# Altium footprint library Connector.PcbLib: 129 footprints (part 8 of 9)
Each footprint in its own frame and in the unit in brackets; x right, y up, seen from the top. Pads: shape width x height; smd on the part's side, far side on the other; paste and mask are expansions set on the pad; w line width, h text height; cw(c..) or ccw(c..) is an arc to the next point about the centre after c.
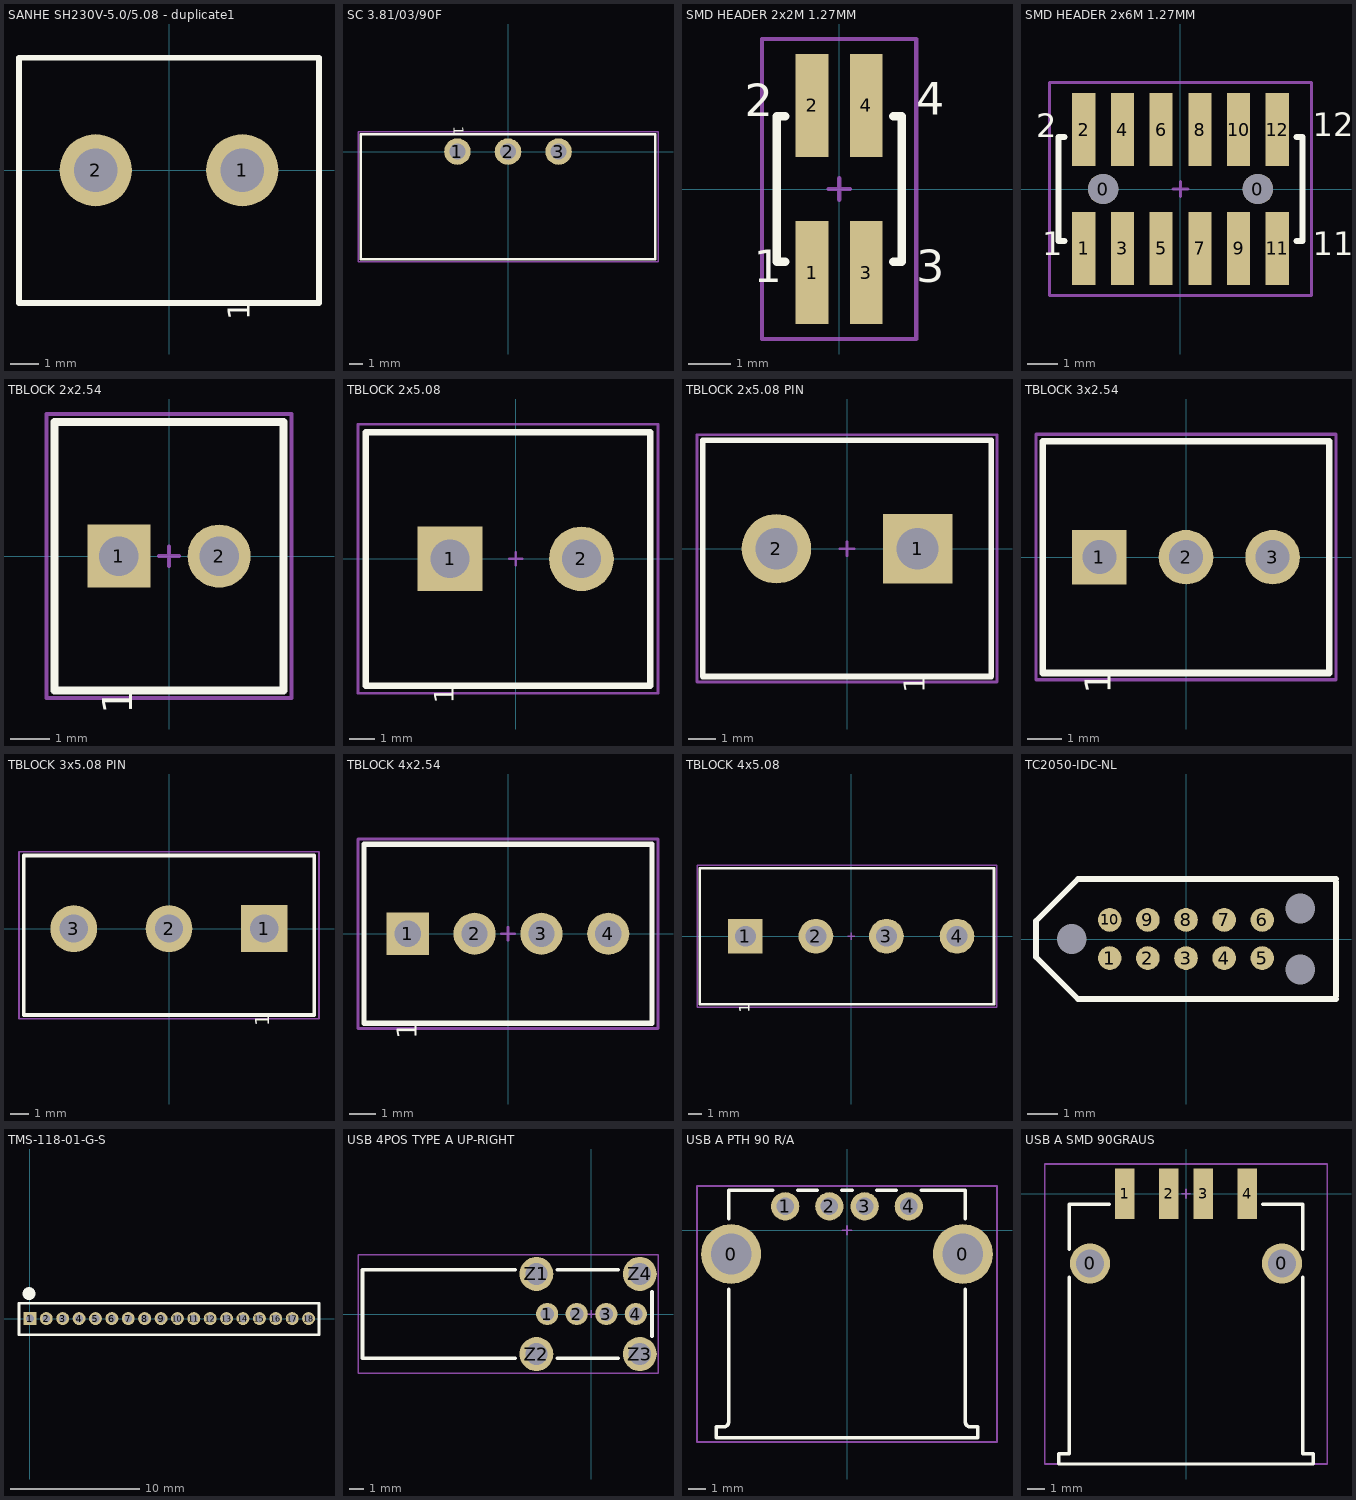
[diagram p7: the footprints below, top view; thin cyan lines are the x and y axes]

## SANHE SH230V-5.0/5.08 - duplicate1 [mm]
pads (2):
  round 2.5 hole 1.5: 1(2.54,0) 2(-2.54,0)
Top Overlay:
  lines w0.2: -5.2,-4.6 -3.3,-4.6 5.2,-4.6 5.2,3.9 -5.2,3.9 -5.2,-4.6
  text "1" at 2.8,-5.2 h0.76
3D body "Terminal Block 2x5.08mm.STEP": height 12.1, standoff -4.5, extent -5.08,-4.45 5.08,3.75

## SC 3.81/03/90F [mm]
height 7.1
pads (3):
  round 2 hole 1.2: 1(-3.81,0) 2(0,0) 3(3.81,0)
Top Overlay:
  lines w0.2: -11.1,-8.1 11.1,-8.1 11.1,1.3 -11.1,1.3 -11.1,-8.1
  text "1" at -4.1,1.9 h0.76
Mechanical 15:
  lines w0.1: -0.25,0 0.25,0 ; 0,-0.25 0,0.25 ; -11.3,-8.3 11.3,-8.3 11.3,1.5 -11.3,1.5 -11.3,-8.3
3D body "SC 3.81_3_90F3.2SN SW 1793340000.STEP": height 7.1, standoff -3.15, extent -11.01,-8 11.01,1.2

## SMD HEADER 2x2M 1.27MM [mm]
pads (4):
  rect 0.76x2.4 smd: 1(-0.635,-1.95) 2(-0.635,1.95) 3(0.635,-1.95) 4(0.635,1.95)
Top Overlay:
  lines w0.2: -1.26,-1.7 -1.46,-1.7 -1.46,1.7 -1.26,1.7 ; 1.26,-1.7 1.46,-1.7 1.46,1.7 1.26,1.7
  text "1" at -2,-2.17 h0.76
  text "3" at 1.8,-2.17 h0.76
  text "4" at 1.8,1.73 h0.76
  text "2" at -2.2,1.7 h0.76
Mechanical 15:
  lines w0.1: -0.25,0 0.25,0 ; 0,-0.25 0,0.25 ; -1.8,-3.5 -1.8,3.5 1.8,3.5 1.8,-3.5 -1.8,-3.5
3D body "pin_header_a-sl127-dg-g04mp1.STEP": height 6.4, standoff 0, extent -1.27,-2.752 1.27,2.752

## SMD HEADER 2x6M 1.27MM [mm]
pads (14):
  round 1 hole 1 unplated: 0(-2.54,0) 0(2.54,0)
  rect 0.76x2.4 smd: 1(-3.175,-1.95) 2(-3.175,1.95) 3(-1.905,-1.95) 4(-1.905,1.95) 5(-0.635,-1.95) 6(-0.635,1.95) 7(0.635,-1.95) 8(0.635,1.95) 9(1.905,-1.95) 10(1.905,1.95) 11(3.175,-1.95) 12(3.175,1.95)
Top Overlay:
  lines w0.2: -3.8,-1.7 -4,-1.7 -4,1.7 -3.8,1.7 ; 3.8,-1.7 4,-1.7 4,1.7 3.8,1.7
  text "2" at -4.74,1.7 h0.76
  text "1" at -4.54,-2.17 h0.76
  text "11" at 4.34,-2.17 h0.76
  text "12" at 4.34,1.73 h0.76
Mechanical 15:
  lines w0.1: -0.25,0 0.25,0 ; 0,-0.25 0,0.25 ; -4.3,-3.5 4.3,-3.5 4.3,3.5 -4.3,3.5 -4.3,-3.5
3D body "pin_header_a-sl127-dg-g12mp1.STEP": height 6.4, standoff 0, extent -3.81,-2.752 3.81,2.752

## TBLOCK 2x2.54 [mm]
pads (2):
  rect 1.6x1.6 hole 1: 1(-1.27,0)
  round 1.6 hole 1: 2(1.27,0)
Top Overlay:
  lines w0.2: -2.9,-3.4 -2.9,3.4 2.9,3.4 2.9,-3.4 -2.9,-3.4
  text "1" at -0.93,-4 h0.76
Mechanical 15:
  lines w0.1: -0.25,0 0.25,0 ; 0,-0.25 0,0.25 ; -3.1,-3.6 3.1,-3.6 3.1,3.6 -3.1,3.6 -3.1,-3.6
3D body "c-282834-2-c-3d.STEP": height 10.1, standoff -3.3, extent -2.77,-3.25 2.77,3.25

## TBLOCK 2x5.08 [mm]
pads (2):
  rect 2.5x2.5 hole 1.5: 1(-2.54,0)
  round 2.5 hole 1.5: 2(2.54,0)
Top Overlay:
  lines w0.254: -5.8,-4.9 5.2,-4.9 5.2,4.9 -5.8,4.9 -5.8,-4.9
  text "1" at -2.4,-5.6 h0.76
Mechanical 15:
  lines w0.1: -0.25,0 0.25,0 ; 0,-0.25 0,0.25 ; -6.1,-5.2 -6.1,5.2 5.5,5.2 5.5,-5.2 -6.1,-5.2
3D body "38261.stp": height 15.5, standoff -3, extent -5.64,-4.75 5.09,4.75

## TBLOCK 2x5.08 PIN [mm]
pads (2):
  rect 2.5x2.5 hole 1.5: 1(2.54,0)
  round 2.5 hole 1.5: 2(-2.54,0)
Top Overlay:
  lines w0.2: -5.2,-4.6 -5.2,3.9 5.2,3.9 5.2,-4.6 -3.3,-4.6 -5.2,-4.6
  text "1" at 2.8,-5.2 h0.76
Mechanical 15:
  lines w0.1: -0.25,0 0.25,0 ; 0,-0.25 0,0.25 ; -5.4,-4.8 5.4,-4.8 5.4,4.1 -5.4,4.1 -5.4,-4.8
3D body "User Library-Terminal Block 2x5_08mm.step": height 12.1, standoff -4.5, extent -5.08,-4.45 5.08,3.75

## TBLOCK 3x2.54 [mm]
pads (3):
  rect 1.6x1.6 hole 1: 1(-2.54,0)
  round 1.6 hole 1: 2(0,0) 3(2.54,0)
Top Overlay:
  lines w0.2: -4.2,-3.4 -4.2,3.4 4.2,3.4 4.2,-3.4 -4.2,-3.4
  text "1" at -2.2,-4 h0.76
Mechanical 15:
  lines w0.1: -0.25,0 0.25,0 ; 0,-0.25 0,0.25 ; -4.4,-3.6 -4.4,3.6 4.4,3.6 4.4,-3.6 -4.4,-3.6
3D body "c-282834-3-c-3d.STEP": height 10.1, standoff -3.3, extent -4.04,-3.25 4.04,3.25

## TBLOCK 3x5.08 PIN [mm]
pads (3):
  rect 2.5x2.5 hole 1.5: 1(5.08,0)
  round 2.5 hole 1.5: 2(0,0) 3(-5.08,0)
Top Overlay:
  lines w0.2: -7.74,-4.6 -0.76,-4.6 7.74,-4.6 7.74,3.9 -7.74,3.9 -7.74,-4.6
  text "1" at 5.34,-5.2 h0.76
Mechanical 15:
  lines w0.1: -0.25,0 0.25,0 ; 0,-0.25 0,0.25 ; -8,-4.8 8,-4.8 8,4.1 -8,4.1 -8,-4.8
3D body "User Library-Terminal Block 3x5_08mm.step": height 12.1, standoff -4.5, extent -7.62,-4.45 7.62,3.75

## TBLOCK 4x2.54 [mm]
pads (4):
  rect 1.6x1.6 hole 1: 1(-3.81,0)
  round 1.6 hole 1: 2(-1.27,0) 3(1.27,0) 4(3.81,0)
Top Overlay:
  lines w0.2: -5.47,-3.4 5.47,-3.4 5.47,3.4 -5.47,3.4 -5.47,-3.4
  text "1" at -3.47,-4 h0.76
Mechanical 15:
  lines w0.1: -0.25,0 0.25,0 ; 0,-0.25 0,0.25 ; -5.7,-3.6 5.7,-3.6 5.7,3.6 -5.7,3.6 -5.7,-3.6
3D body "c-282834-4-c-3d.STEP": height 10.1, standoff -3.3, extent -5.31,-3.25 5.31,3.25

## TBLOCK 4x5.08 [mm]
pads (4):
  rect 2.5x2.5 hole 1.5: 1(-7.62,0)
  round 2.5 hole 1.5: 2(-2.54,0) 3(2.54,0) 4(7.62,0)
Top Overlay:
  lines w0.2: -10.9,-4.9 -10.9,4.9 -2.08,4.9 10.28,4.9 10.28,-4.9 -10.9,-4.9
  text "1" at -7.3,-5.5 h0.76
Mechanical 15:
  lines w0.1: -0.25,0 0.25,0 ; 0,-0.25 0,0.25 ; -11.1,-5.1 -11.1,5.1 10.5,5.1 10.5,-5.1 -11.1,-5.1
3D body "38261.stp": height 15.5, standoff -3, extent -10.72,-4.75 0.01,4.75
3D body "38261.stp": height 15.5, standoff -3, extent -0.56,-4.75 10.17,4.75

## TC2050-IDC-NL [mm]
pads (13):
  round 0.787 smd: 1(-2.54,-0.635) 2(-1.27,-0.635) 3(0,-0.635) 4(1.27,-0.635) 5(2.54,-0.635) 6(2.54,0.635) 7(1.27,0.635) 8(0,0.635) 9(-1.27,0.635) 10(-2.54,0.635)
  round 0 hole 0.991 unplated: 11(-3.81,0) 12(3.81,-1.015) 13(3.81,1.015)
Top Overlay:
  lines w0.2: 5,-2 -3.6,-2 -5,-0.6 -5,0.6 -3.6,2 ; 5,-1.9 5,1.9 ; 5,2 -3.6,2 ; -3.6,2 -3.6,2

## TMS-118-01-G-S [mm]
pads (18):
  rect 1x1 hole 0.6: 1(0,0)
  round 1 hole 0.6: 2(1.27,0) 3(2.54,0) 4(3.81,0) 5(5.08,0) 6(6.35,0) 7(7.62,0) 8(8.89,0) 9(10.16,0) 10(11.43,0) 11(12.7,0) 12(13.97,0) 13(15.24,0) 14(16.51,0) 15(17.78,0) 16(19.05,0) 17(20.32,0) 18(21.59,0)
Top Overlay:
  lines w0.2: -0.845,-1.238 -0.845,1.2 22.4,1.2 22.4,-1.238 -0.845,-1.238
  lines w1: -0.075,1.925 -0.075,1.95
3D body "TMS-118-01-G-S.STEP": height 8.38, standoff -3.05, extent -0.625,-1.238 22.235,1.2

## USB 4POS TYPE A UP-RIGHT [mm]
height 14.5
pads (8):
  round 1.5 hole 0.92: 1(-3,0) 2(-1,0) 3(1,0) 4(3,0)
  round 2.3 hole 1.5: Z1(-3.73,2.71) Z2(-3.73,-2.71) Z3(3.27,-2.71) Z4(3.27,2.71)
Top Overlay:
  lines w0.254: -5.16,-3 -15.5,-3 -15.5,3 -5.16,3 ; -2.3,-3 1.8,-3 ; -2.3,3 1.8,3 ; 4.1,-1.5 4.1,1.5
Mechanical 15:
  lines w0.1: -0.25,0 0.25,0 ; 0,-0.25 0,0.25 ; -15.8,-4 -15.8,4 4.5,4 4.5,-4 -15.8,-4
3D body "STEP-614004134726-rev1.STEP": height 14.51, standoff -3.8, extent -15.345,-3.55 3.955,3.55

## USB A PTH 90 R/A [mm]
height 6.9
pads (6):
  round 3.4 hole 2.3: 0(-6.57,-1.35) 0(6.57,-1.35)
  round 1.6 hole 1: 1(-3.5,1.35) 2(-1,1.35) 3(1,1.35) 4(3.5,1.35)
Top Overlay:
  lines w0.2: -6.7,-3.35 -6.7,-10.85 cw(c-7,-10.85) -7,-11.15 -7.4,-11.15 -7.4,-11.75 7.4,-11.75 7.4,-11.15 7,-11.15 cw(c7,-10.85) 6.7,-10.85 6.7,-3.35 ; -6.7,0.65 -6.7,2.25 -4.2,2.25 ; -2.8,2.25 -1.7,2.25 ; -0.3,2.25 0.3,2.25 ; 1.7,2.25 2.8,2.25 ; 4.2,2.25 6.7,2.25 6.7,0.65
Mechanical 15:
  lines w0.1: -0.25,0 0.25,0 ; 0,-0.25 0,0.25 ; -8.5,-12 8.5,-12 8.5,2.5 -8.5,2.5 -8.5,-12
3D body "M-UE27-AC54-100-REVT1.STEP": height 7.7, standoff -3.05, extent -7.426,-11.65 7.426,2.15

## USB A SMD 90GRAUS [mm] "USB Type A, Receptacle, Standard, SMT, 30u GXT Contact, 4 Pins, Shield with Ni Plating, 1.57 mm PCB, White HSG."
pads (6):
  round 2.3 hole 1.6: 0(-5.5,-4) 0(5.5,-4)
  rect 1.12x2.88 smd: 1(-3.5,0) 2(-1,0) 3(1,0) 4(3.5,0)
Top Overlay:
  lines w0.2: -6.7,-4.8 -6.7,-14.9 -7.3,-14.9 -7.3,-15.5 7.3,-15.5 7.3,-14.9 6.7,-14.9 6.7,-4.8 ; -6.7,-3.2 -6.7,-0.6 -4.4,-0.6 ; 4.4,-0.6 6.7,-0.6 6.7,-3.2
Mechanical 15:
  lines w0.1: -0.25,0 0.25,0 ; 0,-0.25 0,0.25 ; -8.1,-15.5 8.1,-15.5 8.1,1.7 -8.1,1.7 -8.1,-15.5
3D body "14377.stp": height 7.5, standoff -3.4, extent -7.9,-15.3 7.9,0.7